# Altium footprint library 我的封装库.PcbLib: 90 footprints (part 4 of 6)
Each footprint in its own frame and in the unit in brackets; x right, y up, seen from the top. Pads: shape width x height; smd on the part's side, far side on the other; paste and mask are expansions set on the pad; w line width, h text height; cw(c..) or ccw(c..) is an arc to the next point about the centre after c.
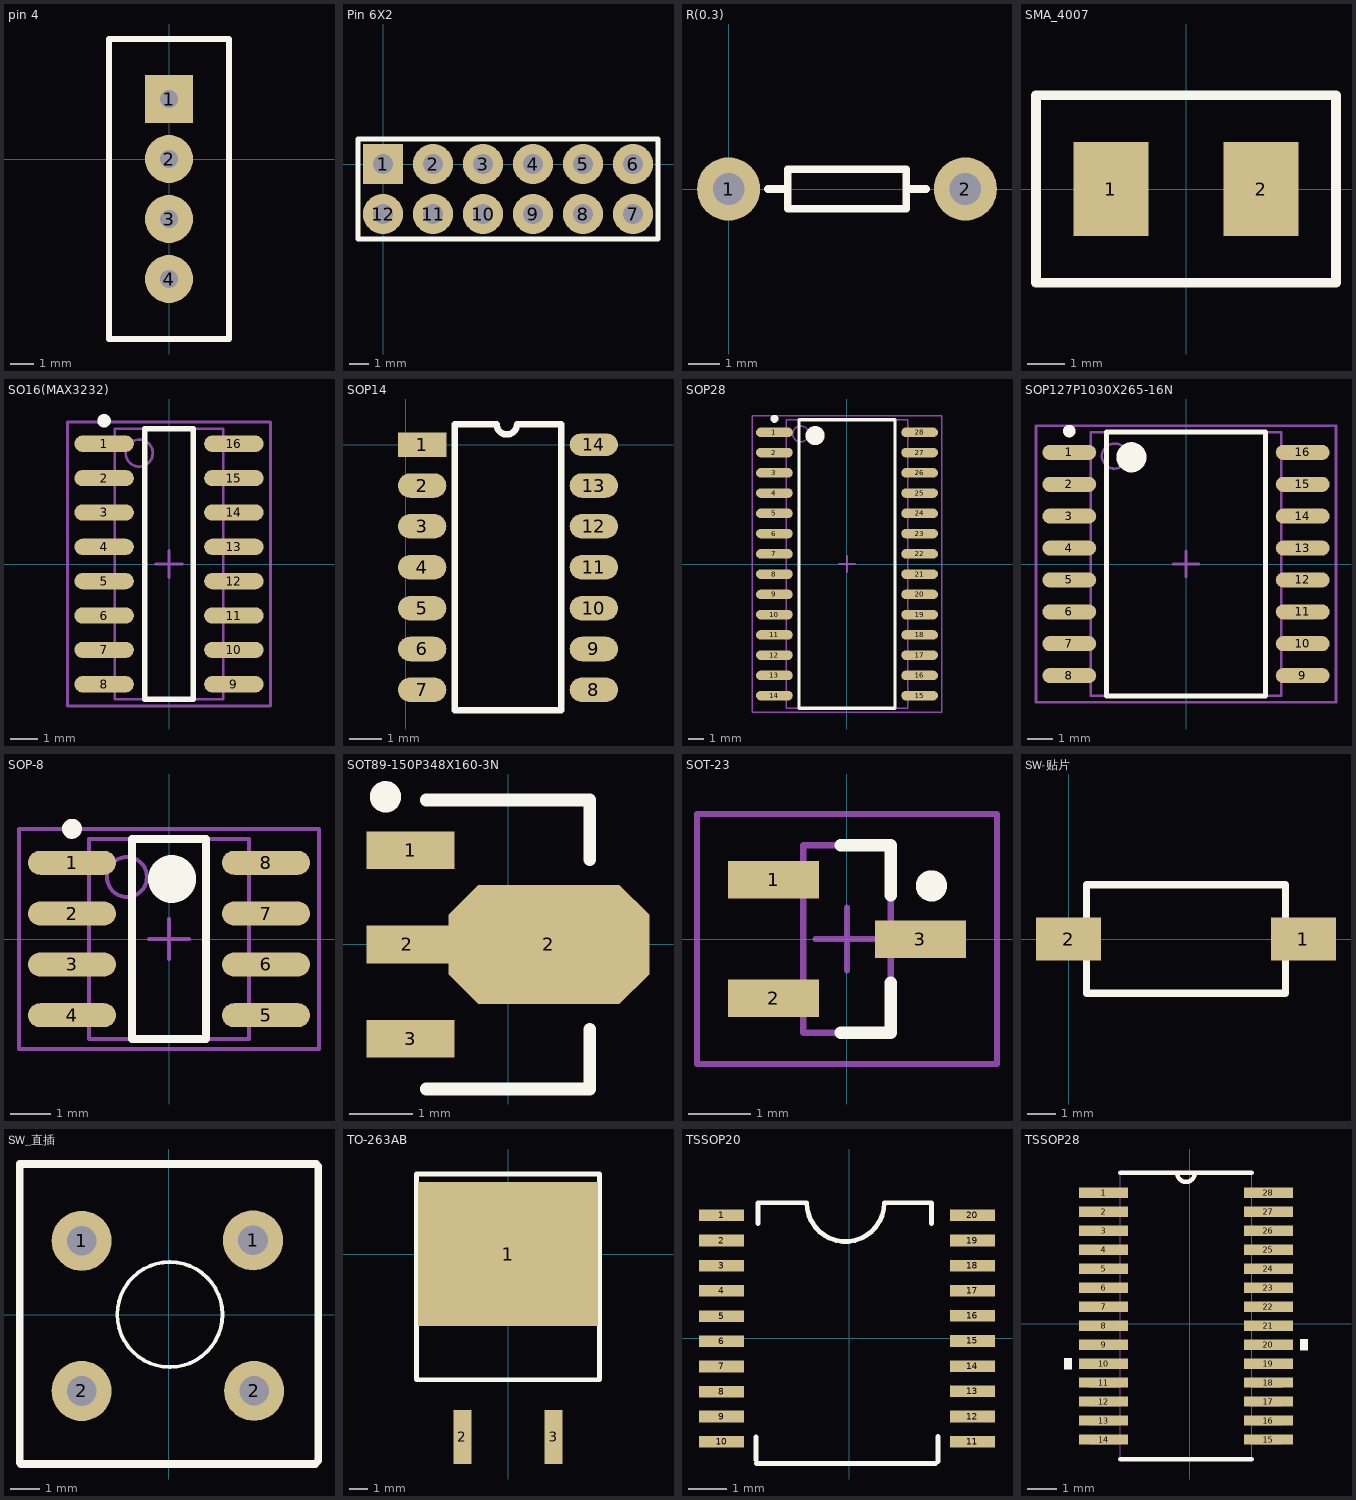
[diagram p3: the footprints below, top view; thin cyan lines are the x and y axes]

## pin 4 [mil]
pads (4):
  rect 80x80 hole 30: 1(0,100)
  round 80 hole 30: 2(0,0) 3(0,-100) 4(0,-200)
Top Overlay:
  lines w10: -100,-300 -100,200 100,200 100,-300 -100,-300

## Pin 6X2 [mil]
pads (12):
  rect 80x80 hole 40: 1(0,0)
  round 80 hole 40: 2(100,0) 3(200,0) 4(300,0) 5(400,0) 6(500,0) 7(500,-100) 8(400,-100) 9(300,-100) 10(200,-100) 11(100,-100) 12(0,-100)
Top Overlay:
  lines w10: -50,-150 550,-150 550,50 -50,50 -50,-150

## R(0.3) [mil]
pads (2):
  round 80 hole 40: 1(0,0) 2(300,0)
Top Overlay:
  lines w10: 50,0 75,0 ; 225,0 250,0 ; 75,-25 225,-25 225,25 75,25 75,-25

## SMA_4007 [mm]
pads (2):
  rect 2x2.5 smd: 1(-2,0) 2(2,0)
Top Overlay:
  lines w0.254: -4,-2.5 -4,2.5 4,2.5 4,-2.5 -4,-2.5

## SO16(MAX3232) [mm]
pads (16):
  oval 2.2x0.6 smd: 1(-2.4,4.445) 2(-2.4,3.175) 3(-2.4,1.905) 4(-2.4,0.635) 5(-2.4,-0.635) 6(-2.4,-1.905) 7(-2.4,-3.175) 8(-2.4,-4.445) 9(2.4,-4.445) 10(2.4,-3.175) 11(2.4,-1.905) 12(2.4,-0.635) 13(2.4,0.635) 14(2.4,1.905) 15(2.4,3.175) 16(2.4,4.445)
Top Overlay:
  circle w0.25: c-2.4,5.295 r0.125
  lines w0.2: -0.9,-5 0.9,-5 0.9,5 -0.9,5 -0.9,-5
Mechanical 13:
  circle w0.1: c-1.1,4.1 r0.5
  lines w0.1: -2,-5 2,-5 2,5 -2,5 -2,-5
Mechanical 15:
  lines w0.1: -0.5,0 0.5,0 ; 0,-0.5 0,0.5 ; -3.75,-5.25 3.75,-5.25 3.75,5.25 -3.75,5.25 -3.75,-5.25
3D body: height 1.75, standoff 0, extent -2,-5 2,5

## SOP14 [mil]
pads (14):
  rect 59.06x30 smd: 1(20,0)
  oval 59.06x30 smd: 2(20,-50) 3(20,-100) 4(20,-150) 5(20,-200) 6(20,-250) 7(20,-300) 8(230,-300) 9(230,-250) 10(230,-200) 11(230,-150) 12(230,-100) 13(230,-50)
  oval 59.06x27.56 smd: 14(230,0)
Top Overlay:
  lines w7.87: 60,-325 60,25 111.04,25 ccw(c123.54,25) 136.04,25 190,25 190,-325 60,-325

## SOP28 [mm]
pads (28):
  oval 2.3x0.6 smd: 1(-4.55,8.255) 2(-4.55,6.985) 3(-4.55,5.715) 4(-4.55,4.445) 5(-4.55,3.175) 6(-4.55,1.905) 7(-4.55,0.635) 8(-4.55,-0.635) 9(-4.55,-1.905) 10(-4.55,-3.175) 11(-4.55,-4.445) 12(-4.55,-5.715) 13(-4.55,-6.985) 14(-4.55,-8.255) 15(4.55,-8.255) 16(4.55,-6.985) 17(4.55,-5.715) 18(4.55,-4.445) 19(4.55,-3.175) 20(4.55,-1.905) 21(4.55,-0.635) 22(4.55,0.635) 23(4.55,1.905) 24(4.55,3.175) 25(4.55,4.445) 26(4.55,5.715) 27(4.55,6.985) 28(4.55,8.255)
Top Overlay:
  circle w0.6: c-2,8.05 r0.3
  circle w0.25: c-4.55,9.105 r0.125
  lines w0.2: -3,-9.05 3,-9.05 3,9.05 -3,9.05 -3,-9.05
Mechanical 13:
  circle w0.1: c-2.9,8.155 r0.5
  lines w0.1: -3.8,-9.055 3.8,-9.055 3.8,9.055 -3.8,9.055 -3.8,-9.055
Mechanical 15:
  lines w0.1: -0.5,0 0.5,0 ; 0,-0.5 0,0.5 ; -5.95,-9.3 5.95,-9.3 5.95,9.3 -5.95,9.3 -5.95,-9.3
3D body: height 2.65, standoff 0, extent -3.8,-9.055 3.8,9.055

## SOP127P1030X265-16N [mm] "SOP, 16-Leads, Body 10.5x7.6mm (max), Pitch 1.27mm, IPC Medium Density"
height 2.65
pads (16):
  oval 2.15x0.6 smd: 1(-4.65,4.445) 2(-4.65,3.175) 3(-4.65,1.905) 4(-4.65,0.635) 5(-4.65,-0.635) 6(-4.65,-1.905) 7(-4.65,-3.175) 8(-4.65,-4.445) 9(4.65,-4.445) 10(4.65,-3.175) 11(4.65,-1.905) 12(4.65,-0.635) 13(4.65,0.635) 14(4.65,1.905) 15(4.65,3.175) 16(4.65,4.445)
Top Overlay:
  circle w0.6: c-2.175,4.25 r0.3
  circle w0.25: c-4.65,5.295 r0.125
  lines w0.2: -3.175,-5.25 3.175,-5.25 3.175,5.25 -3.175,5.25 -3.175,-5.25
Mechanical 13:
  circle w0.1: c-2.85,4.3 r0.5
  lines w0.1: -3.8,-5.25 3.8,-5.25 3.8,5.25 -3.8,5.25 -3.8,-5.25
Mechanical 15:
  lines w0.1: -0.5,0 0.5,0 ; 0,-0.5 0,0.5 ; -5.975,-5.5 5.975,-5.5 5.975,5.5 -5.975,5.5 -5.975,-5.5
3D body: height 2.65, standoff 0.25, extent -3.8,-5.25 3.8,5.25

## SOP-8 [mm] "SOP, 8-Leads, Body 5.0x4.0mm (max), Pitch 1.27mm, IPC Medium Density"
height 1.75
pads (8):
  oval 2.2x0.6 smd: 1(-2.425,1.905) 2(-2.425,0.635) 3(-2.425,-0.635) 4(-2.425,-1.905) 5(2.425,-1.905) 6(2.425,-0.635) 7(2.425,0.635) 8(2.425,1.905)
Top Overlay:
  circle w0.6: c0.075,1.5 r0.3
  circle w0.25: c-2.425,2.755 r0.125
  lines w0.2: -0.925,-2.5 0.925,-2.5 0.925,2.5 -0.925,2.5 -0.925,-2.5
Mechanical 13:
  circle w0.1: c-1.05,1.55 r0.5
  lines w0.1: -2,-2.5 2,-2.5 2,2.5 -2,2.5 -2,-2.5
Mechanical 15:
  lines w0.1: -0.5,0 0.5,0 ; 0,-0.5 0,0.5 ; -3.75,-2.75 3.75,-2.75 3.75,2.75 -3.75,2.75 -3.75,-2.75
3D body: height 1.75, standoff 0.19, extent -2,-2.5 2,2.5

## SOT89-150P348X160-3N [mm] "SOT89, 3-Leads, Body 4.5x2.4mm (max), Pitch 1.50mm, Lead Span 3.5mm, IPC Medium Density"
height 1.6
pads (4):
  rect 1.4x0.6 smd: 1(-1.55,1.5) 3(-1.55,-1.5)
  rect 1.3x0.6 smd: 2(-1.6,0)
  oct 3.2x1.9 smd: 2(0.65,0)
Top Overlay:
  circle w0.25: c-1.95,2.35 r0.125
  lines w0.2: -1.3,-2.3 1.3,-2.3 1.3,-1.35 ; -1.3,2.3 1.3,2.3 1.3,1.35
Mechanical 15:
  lines w0.1: -0.5,0 0.5,0 ; 0,-0.5 0,0.5

## SOT-23 [mm]
pads (3):
  rect 1.45x0.6 smd: 1(-1.175,0.95) 2(-1.175,-0.95) 3(1.175,0)
Top Overlay:
  circle w0.25: c1.35,0.85 r0.125
  lines w0.2: -0.1,-1.5 0.7,-1.5 0.7,-0.7 ; -0.1,1.5 0.7,1.5 0.7,0.7
Mechanical 13:
  lines w0.1: -0.7,-1.5 0.7,-1.5 0.7,1.5 -0.7,1.5 -0.7,-1.5
Mechanical 15:
  lines w0.1: -0.5,0 0.5,0 ; 0,-0.5 0,0.5 ; -2.4,-2 2.4,-2 2.4,2 -2.4,2 -2.4,-2
3D body: height 1.1, standoff 0, extent -0.7,-1.5 0.7,1.5

## SW-贴片 [mil]
pads (2):
  rect 90x60 smd: 1(325,0) 2(0,0)
Top Overlay:
  lines w10: 25,-75 300,-75 300,75 25,75 25,-75

## SW_直插 [mil]
pads (4):
  round 80 hole 39.37: 1(-115.98,98.55) 1(112.22,99.14) 2(-115.98,-101.45) 2(113.67,-101.36)
Top Overlay:
  circle w5: c1.54,0.35 r70
  lines w10: -198.7,-197.25 -198.7,200.85 196.49,200.85 199.39,197.94 199.39,-194.34 195.04,-198.7 -197.25,-198.7 -198.7,-197.25

## TO-263AB [mm]
pads (3):
  rect 10x8 smd: 1(0,0)
  rect 1x3 smd: 2(-2.54,-10.16) 3(2.54,-10.16)
Top Overlay:
  lines w0.254: -5.08,-6.985 -5.08,4.445 5.08,4.445 5.08,-6.985 -5.08,-6.985

## TSSOP20 [mm] "STM8_103"
pads (20):
  rect 1.15x0.3 smd: 1(-3.302,3.175) 2(-3.302,2.525) 3(-3.302,1.875) 4(-3.302,1.225) 5(-3.302,0.575) 6(-3.302,-0.075) 7(-3.302,-0.725) 8(-3.302,-1.375) 9(-3.302,-2.017) 10(-3.302,-2.667) 11(3.175,-2.667) 12(3.175,-2.017) 13(3.175,-1.367) 14(3.175,-0.717) 15(3.175,-0.067) 16(3.175,0.583) 17(3.175,1.225) 18(3.175,1.875) 19(3.175,2.525) 20(3.175,3.175)
Top Overlay:
  lines w0.127: -2.413,-3.145 -2.413,-2.54 ; -2.395,-3.224 2.225,-3.224 ; -2.365,2.969 -2.365,3.5 -1.102,3.5 ccw(c-0.102,3.5) 0.898,3.5 2.121,3.5 2.121,2.959 ; 2.286,-3.175 2.286,-2.529

## TSSOP28 [mil] "DAC900"
pads (28):
  rect 66x14 smd: 1(-116,176.34) 2(-116,150.75) 3(-116,125.16) 4(-116,99.57) 5(-116,73.98) 6(-116,48.39) 7(-116,22.8) 8(-116,-2.8) 9(-116,-28.39) 10(-116,-53.98) 11(-116,-79.57) 12(-116,-105.16) 13(-116,-130.75) 14(-116,-156.34) 15(106,-156.34) 16(106,-130.75) 17(106,-105.16) 18(106,-79.57) 19(106,-53.98) 20(106,-28.39) 21(106,-2.8) 22(106,22.8) 23(106,48.39) 24(106,73.98) 25(106,99.57) 26(106,125.16) 27(106,150.75) 28(106,176.34)
Top Overlay:
  region: 149,-20.89 159,-20.89 159,-35.89 149,-35.89
  region: -159,-46.48 -169,-46.48 -169,-61.48 -159,-61.48
  lines w6: -93.5,-183 83.5,-183 ; -93.5,203 83.5,203 ; -17,203 ccw(c-5,203) 7,203
Mechanical 1:
  lines w0: -17,203 ccw(c-5,203) 7,203 ; -135,-162.34 -93.5,-162.34 -93.5,-150.34 -135,-150.34 -135,-162.34 ; -135,-136.75 -93.5,-136.75 -93.5,-124.75 -135,-124.75 -135,-136.75 ; -135,-111.16 -93.5,-111.16 -93.5,-99.16 -135,-99.16 -135,-111.16 ; -135,-85.57 -93.5,-85.57 -93.5,-73.57 -135,-73.57 -135,-85.57 ; -135,-59.98 -93.5,-59.98 -93.5,-47.98 -135,-47.98 -135,-59.98 ; -135,-34.39 -93.5,-34.39 -93.5,-22.39 -135,-22.39 -135,-34.39 ; -135,-8.8 -93.5,-8.8 -93.5,3.2 -135,3.2 -135,-8.8 ; -135,16.8 -93.5,16.8 -93.5,28.8 -135,28.8 -135,16.8 ; -135,42.39 -93.5,42.39 -93.5,54.39 -135,54.39 -135,42.39 ; -135,67.98 -93.5,67.98 -93.5,79.98 -135,79.98 -135,67.98 ; -135,93.57 -93.5,93.57 -93.5,105.57 -135,105.57 -135,93.57 ; -135,119.16 -93.5,119.16 -93.5,131.16 -135,131.16 -135,119.16 ; -135,144.75 -93.5,144.75 -93.5,156.75 -135,156.75 -135,144.75 ; -135,170.34 -93.5,170.34 -93.5,182.34 -135,182.34 -135,170.34 ; -93.5,-183 -93.5,203 83.5,203 83.5,-183 -93.5,-183 ; 83.5,-162.34 125,-162.34 125,-150.34 83.5,-150.34 83.5,-162.34 ; 83.5,-136.75 125,-136.75 125,-124.75 83.5,-124.75 83.5,-136.75 ; 83.5,-111.16 125,-111.16 125,-99.16 83.5,-99.16 83.5,-111.16 ; 83.5,-85.57 125,-85.57 125,-73.57 83.5,-73.57 83.5,-85.57 ; 83.5,-59.98 125,-59.98 125,-47.98 83.5,-47.98 83.5,-59.98 ; 83.5,-34.39 125,-34.39 125,-22.39 83.5,-22.39 83.5,-34.39 ; 83.5,-8.8 125,-8.8 125,3.2 83.5,3.2 83.5,-8.8 ; 83.5,16.8 125,16.8 125,28.8 83.5,28.8 83.5,16.8 ; 83.5,42.39 125,42.39 125,54.39 83.5,54.39 83.5,42.39 ; 83.5,67.98 125,67.98 125,79.98 83.5,79.98 83.5,67.98 ; 83.5,93.57 125,93.57 125,105.57 83.5,105.57 83.5,93.57 ; 83.5,119.16 125,119.16 125,131.16 83.5,131.16 83.5,119.16 ; 83.5,144.75 125,144.75 125,156.75 83.5,156.75 83.5,144.75 ; 83.5,170.34 125,170.34 125,182.34 83.5,182.34 83.5,170.34